# Altium footprint library 左手键盘1.PcbLib: 20 footprints (part 1 of 2)
Each footprint in its own frame and in the unit in brackets; x right, y up, seen from the top. Pads: shape width x height; smd on the part's side, far side on the other; paste and mask are expansions set on the pad; w line width, h text height; cw(c..) or ccw(c..) is an arc to the next point about the centre after c.
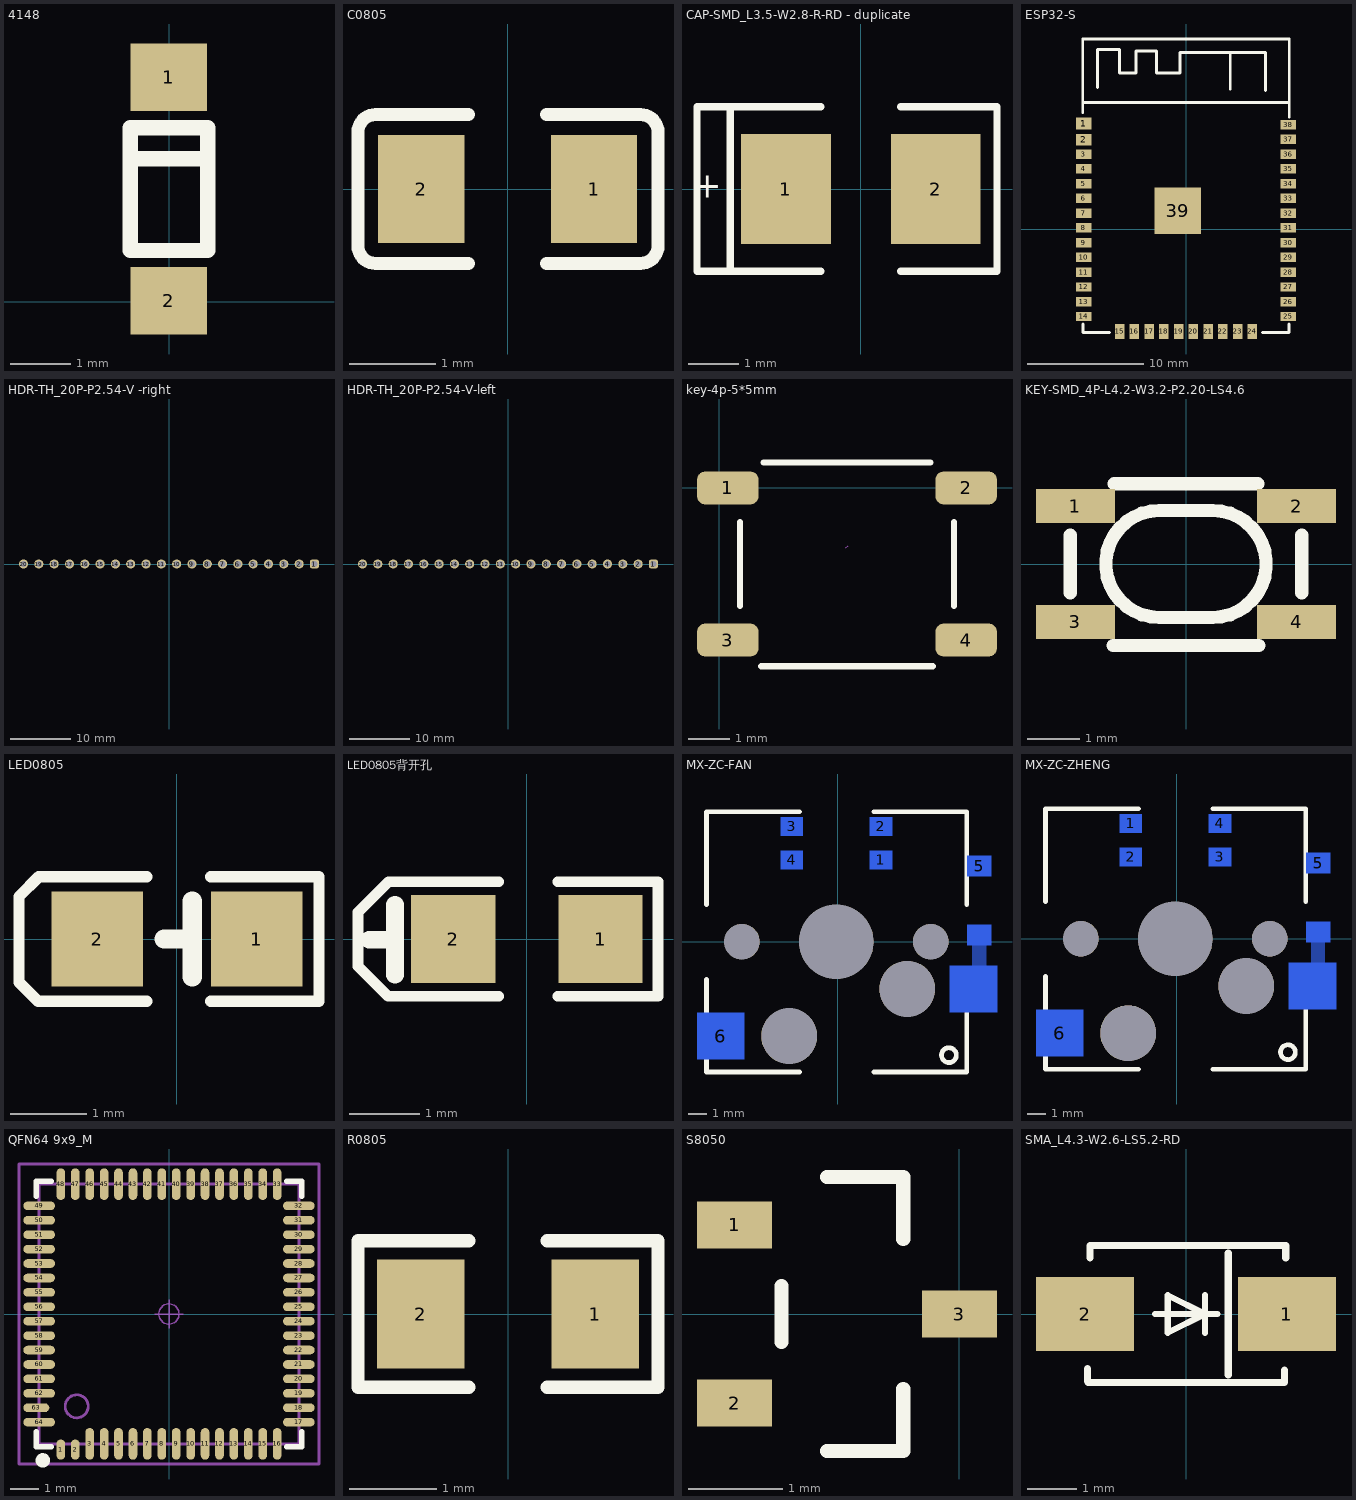
[diagram p0: the footprints below, top view; thin cyan lines are the x and y axes]

## 4148 [mm]
pads (2):
  rect 1.27x1.118 smd: 1(-0.01,3.729) 2(-0.01,0.02)
Top Overlay:
  lines w0.254: -0.65,2.377 0.64,2.377 ; -0.65,0.853 0.64,0.853 0.64,2.889 -0.65,2.889 -0.65,0.853
3D body "User Library-Diode MELF.STEP": height 1.55, standoff 0.05, extent -0.76,0.14 0.74,3.64

## C0805 [mm]
pads (2):
  rect 1x1.25 smd: 1(1,0) 2(-1,0)
Top Overlay:
  lines w0.15: -1.73,-0.66 ccw(c-1.53,-0.66) -1.53,-0.86 -0.45,-0.86 ; -1.73,-0.65 -1.73,0.65 ; -1.73,0.66 cw(c-1.53,0.66) -1.53,0.86 -0.45,0.86 ; 0.45,-0.86 1.53,-0.86 ; 0.45,0.86 1.54,0.86 cw(c1.54,0.66) 1.74,0.66 ; 1.54,-0.86 ccw(c1.54,-0.66) 1.74,-0.66 1.74,0.67
3D body "Capacitor 0805 SMD1.step": height 0.78, standoff 0, extent -1,-0.625 1,0.625

## CAP-SMD_L3.5-W2.8-R-RD - duplicate [mm]
pads (2):
  rect 1.8x2.2 smd: 1(-1.501,0) 2(1.501,0)
Top Overlay:
  lines w0.15: -2.727,-1.65 -0.8,-1.65 ; -2.727,1.65 -0.8,1.65 ; 0.8,-1.65 2.727,-1.65 2.727,1.65 0.8,1.65 ; -3.28,-1.65 -2.61,-1.65 -2.61,1.65 -3.28,1.65 -3.28,-1.65
  text "+" at -2.78,0.263 h0.5
3D body "User Library-AVX_BCASE.STEP": height 2.03, standoff 0, extent -1.85,-1.465 1.85,1.465

## ESP32-S [mm]
pads (39):
  rect 1.3x1 smd: 1(-8.8,9.1) 2(-8.8,7.7)
  rect 1.3x0.8 smd: 3(-8.8,6.465) 4(-8.8,5.195) 5(-8.8,3.925) 6(-8.8,2.655) 7(-8.8,1.385) 8(-8.8,0.115) 9(-8.8,-1.155) 10(-8.8,-2.425) 11(-8.8,-3.695) 12(-8.8,-4.965) 13(-8.8,-6.235) 14(-8.8,-7.505) 25(8.8,-7.505) 26(8.8,-6.235) 27(8.8,-4.965) 28(8.8,-3.695) 29(8.8,-2.425) 30(8.8,-1.155) 31(8.8,0.115) 32(8.8,1.385) 33(8.8,2.655) 34(8.8,3.925) 35(8.8,5.195) 36(8.8,6.465) 37(8.8,7.735) 38(8.8,9.005)
  rect 0.8x1.3 smd: 15(-5.715,-8.8) 16(-4.445,-8.8) 17(-3.175,-8.8) 18(-1.905,-8.8) 19(-0.635,-8.8) 20(0.635,-8.8) 21(1.905,-8.8) 22(3.175,-8.8) 23(4.445,-8.8) 24(5.715,-8.8)
  rect 4x4 smd: 39(-0.71,1.605)
Top Overlay:
  lines w0.254: -8.89,10.033 -8.89,16.376 8.89,16.376 8.89,9.645 ; -8.89,10.915 8.89,10.915 ; -8.88,-8.15 -8.88,-8.882 -6.594,-8.882 ; -7.62,12.184 -7.62,15.486 -5.715,15.486 -5.715,13.454 -4.318,13.454 -4.318,15.359 -2.54,15.359 -2.54,13.454 -0.508,13.454 -0.508,15.232 6.858,15.232 6.858,11.93 ; 3.81,12.058 3.81,15.233 ; 6.594,-8.882 8.88,-8.882 8.88,-8.15
3D body "User Library-ESP321.STEP": height 2.91, standoff -0.01, extent -9,-9 9,16.5

## HDR-TH_20P-P2.54-V -right [mm]
pads (20):
  rrect50% 1.5x1.5 hole 1: 1(24.13,0)
  round 1.5 hole 1: 2(21.59,0) 3(19.05,0) 4(16.51,0) 5(13.97,0) 6(11.43,0) 7(8.89,0) 8(6.35,0) 9(3.81,0) 10(1.27,0) 11(-1.27,0) 12(-3.81,0) 13(-6.35,0) 14(-8.89,0) 15(-11.43,0) 16(-13.97,0) 17(-16.51,0) 18(-19.05,0) 19(-21.59,0) 20(-24.13,0)
3D body "HDR2.54-1P_H.STEP": height 1.85, standoff -6, extent 22.86,-7.77 25.4,1.27
3D body "HDR2.54-1P_H.STEP": height 1.85, standoff -6, extent 20.32,-7.77 22.86,1.27
3D body "HDR2.54-1P_H.STEP": height 1.85, standoff -6, extent 17.78,-7.77 20.32,1.27
3D body "HDR2.54-1P_H.STEP": height 1.85, standoff -6, extent 15.24,-7.77 17.78,1.27
3D body "HDR2.54-1P_H.STEP": height 1.85, standoff -6, extent 12.7,-7.77 15.24,1.27
3D body "HDR2.54-1P_H.STEP": height 1.85, standoff -6, extent 10.16,-7.77 12.7,1.27
3D body "HDR2.54-1P_H.STEP": height 1.85, standoff -6, extent 7.62,-7.77 10.16,1.27
3D body "HDR2.54-1P_H.STEP": height 1.85, standoff -6, extent 5.08,-7.77 7.62,1.27
3D body "HDR2.54-1P_H.STEP": height 1.85, standoff -6, extent 2.54,-7.77 5.08,1.27
3D body "HDR2.54-1P_H.STEP": height 1.85, standoff -6, extent 0,-7.77 2.54,1.27
3D body "HDR2.54-1P_H.STEP": height 1.85, standoff -6, extent -2.54,-7.77 0,1.27
3D body "HDR2.54-1P_H.STEP": height 1.85, standoff -6, extent -5.08,-7.77 -2.54,1.27
3D body "HDR2.54-1P_H.STEP": height 1.85, standoff -6, extent -7.62,-7.77 -5.08,1.27
3D body "HDR2.54-1P_H.STEP": height 1.85, standoff -6, extent -10.16,-7.77 -7.62,1.27
3D body "HDR2.54-1P_H.STEP": height 1.85, standoff -6, extent -12.7,-7.77 -10.16,1.27
3D body "HDR2.54-1P_H.STEP": height 1.85, standoff -6, extent -15.24,-7.77 -12.7,1.27
3D body "HDR2.54-1P_H.STEP": height 1.85, standoff -6, extent -17.78,-7.77 -15.24,1.27
3D body "HDR2.54-1P_H.STEP": height 1.85, standoff -6, extent -20.32,-7.77 -17.78,1.27
3D body "HDR2.54-1P_H.STEP": height 1.85, standoff -6, extent -22.86,-7.77 -20.32,1.27
3D body "HDR2.54-1P_H.STEP": height 1.85, standoff -6, extent -25.4,-7.77 -22.86,1.27

## HDR-TH_20P-P2.54-V-left [mm]
pads (20):
  rrect50% 1.5x1.5 hole 1: 1(24.13,0)
  round 1.5 hole 1: 2(21.59,0) 3(19.05,0) 4(16.51,0) 5(13.97,0) 6(11.43,0) 7(8.89,0) 8(6.35,0) 9(3.81,0) 10(1.27,0) 11(-1.27,0) 12(-3.81,0) 13(-6.35,0) 14(-8.89,0) 15(-11.43,0) 16(-13.97,0) 17(-16.51,0) 18(-19.05,0) 19(-21.59,0) 20(-24.13,0)
3D body "HDR2.54-1P_H.STEP": height 1.85, standoff -6, extent 22.86,-1.27 25.4,7.77
3D body "HDR2.54-1P_H.STEP": height 1.85, standoff -6, extent 17.78,-1.27 20.32,7.77
3D body "HDR2.54-1P_H.STEP": height 1.85, standoff -6, extent 15.24,-1.27 17.78,7.77
3D body "HDR2.54-1P_H.STEP": height 1.85, standoff -6, extent 12.7,-1.27 15.24,7.77
3D body "HDR2.54-1P_H.STEP": height 1.85, standoff -6, extent 10.16,-1.27 12.7,7.77
3D body "HDR2.54-1P_H.STEP": height 1.85, standoff -6, extent 7.62,-1.27 10.16,7.77
3D body "HDR2.54-1P_H.STEP": height 1.85, standoff -6, extent 5.08,-1.27 7.62,7.77
3D body "HDR2.54-1P_H.STEP": height 1.85, standoff -6, extent 2.54,-1.27 5.08,7.77
3D body "HDR2.54-1P_H.STEP": height 1.85, standoff -6, extent 0,-1.27 2.54,7.77
3D body "HDR2.54-1P_H.STEP": height 1.85, standoff -6, extent -2.54,-1.27 0,7.77
3D body "HDR2.54-1P_H.STEP": height 1.85, standoff -6, extent -5.08,-1.27 -2.54,7.77
3D body "HDR2.54-1P_H.STEP": height 1.85, standoff -6, extent -7.62,-1.27 -5.08,7.77
3D body "HDR2.54-1P_H.STEP": height 1.85, standoff -6, extent -10.16,-1.27 -7.62,7.77
3D body "HDR2.54-1P_H.STEP": height 1.85, standoff -6, extent -12.7,-1.27 -10.16,7.77
3D body "HDR2.54-1P_H.STEP": height 1.85, standoff -6, extent -15.24,-1.27 -12.7,7.77
3D body "HDR2.54-1P_H.STEP": height 1.85, standoff -6, extent -17.78,-1.27 -15.24,7.77
3D body "HDR2.54-1P_H.STEP": height 1.85, standoff -6, extent -20.32,-1.27 -17.78,7.77
3D body "HDR2.54-1P_H.STEP": height 1.85, standoff -6, extent -22.86,-1.27 -20.32,7.77
3D body "HDR2.54-1P_H.STEP": height 1.85, standoff -6, extent -25.4,-1.27 -22.86,7.77
3D body "HDR2.54-1P_H.STEP": height 1.85, standoff -6, extent 20.32,-1.27 22.86,7.77

## key-4p-5*5mm [mm] "贴片轻触开关"
pads (4):
  rrect50% 1.5x0.8 smd: 1(0.21,-0.01) 2(6.01,-0.01) 3(0.21,-3.71) 4(6.01,-3.71)
Top Overlay:
  lines w0.15: 0.51,-2.879 0.51,-0.841 ; 1.023,-4.35 5.197,-4.35 ; 1.085,0.61 5.135,0.61 ; 5.71,-2.879 5.71,-0.841
Mechanical 15:
  lines w0.003: 3.085,-1.464 3.135,-1.413
3D body "User Library-44-1.STEP": height 1.5, standoff 0, extent -0.09,-4.42 6.31,0.68

## KEY-SMD_4P-L4.2-W3.2-P2.20-LS4.6 [mm]
pads (4):
  rect 1.5x0.65 smd: 1(-2.1,1.1) 2(2.1,1.1) 3(-2.1,-1.1) 4(2.1,-1.1)
Top Overlay:
  lines w0.254: -2.2,-0.544 -2.2,0.544 ; -1.381,-1.55 1.381,-1.55 ; -1.366,1.524 1.366,1.524 ; 2.2,-0.544 2.2,0.544 ; -0.508,-1.016 cw(c-0.508,0) -0.508,1.016 0.508,1.016 cw(c0.508,0) 0.508,-1.016 -0.508,-1.016
3D body "User Library-SKSGAAE010 3_2x2_7x1_4.STEP": height 1.6, standoff 0, extent -1.75,-1.35 1.75,1.35

## LED0805 [mm]
pads (2):
  rect 1.2x1.25 smd: 1(1.05,0) 2(-1.05,0)
Top Overlay:
  lines w0.15: -0.4,-0.82 -1.83,-0.82 -2.08,-0.57 -2.08,0.56 -1.82,0.82 -0.4,0.82 ; 0.443,-0.82 1.87,-0.82 1.87,-0.82 1.87,0.82 0.443,0.82
  lines w0.254: -0.169,0 0.1,0 ; 0.2,-0.5 0.2,0.5
3D body "everlight-17-21-0805LED-red.STEP": height 1.1, standoff -0.01, extent -1,-0.625 1,0.625

## LED0805背开孔 [mm]
pads (2):
  rect 1.2x1.25 smd: 1(1.05,0) 2(-1.05,0)
Top Overlay:
  lines w0.15: -0.4,-0.82 -1.98,-0.82 -2.41,-0.39 -2.41,0.38 -1.97,0.82 -0.4,0.82 ; 0.443,-0.82 1.87,-0.82 1.87,-0.82 1.87,0.82 0.443,0.82
  lines w0.254: -2.249,-0.01 -1.98,-0.01 ; -1.88,-0.51 -1.88,0.49
3D body "everlight-17-21-0805LED-red.STEP": height 0.61, standoff -0.5, extent -1,-0.625 1,0.625

## MX-ZC-FAN [mm]
pads (13):
  rect 1.2x1 smd far side: 1(2.336,4.4) 2(2.336,6.2) 3(-2.464,6.2) 4(-2.464,4.4)
  rect 1.27x1.118 smd far side: 5(7.62,4.069) ""(7.62,0.36)
  rect 2.55x2.499 smd far side: 6(-6.286,-5.08) ""(7.302,-2.54)
  round 1.905 hole 1.905 unplated: ""(-5.143,0) ""(5.016,0)
  round 3 hole 3 unplated: ""(-2.603,-5.08) ""(3.746,-2.54)
  round 4 hole 4 unplated: ""(-0.064,0)
Bottom Layer:
  lines w0.762: 7.62,-3.142 7.62,0.36
Top Overlay:
  circle w0.254: c5.992,-6.106 r0.399
  circle w0.254: c5.992,-6.106 r0.399
  lines w0.254: -7.048,-2.015 -7.048,-7.015 -2.048,-7.015 ; -7.048,1.985 -7.048,6.985 -2.048,6.985 ; 1.951,-7.015 6.951,-7.015 6.951,-2.015 ; 1.951,6.985 6.951,6.985 6.951,1.985
Bottom Overlay:
  region: -1.959,7.302 -2.458,7.302 -2.458,6.802
  lines w0.152: -3.78,6.159 -3.356,6.159 ; 3.278,4.308 3.702,4.308 ; 3.502,4.083 3.502,4.508
  lines w0.254: 2.476,-1.016 3.238,-1.016 ; 2.532,-1.016 cw(c0.488,-0.73) 0.444,-2.794 -4.889,-2.794 -4.889,-6.858 4.255,-6.858 ccw(c4.263,-5.089) 6.032,-5.08 6.032,-1.016 2.73,-1.016 ; 6.95,2.697 8.24,2.697 ; 6.95,1.173 6.95,3.209 8.24,3.209 8.24,1.173 6.95,1.173
3D body "User Library-Diode MELF.STEP": height -0.85, standoff -2.35, extent 6.87,0.48 8.37,3.98
3D body "User Library-MX-Blue.STEP": height 14.9, standoff -4, extent -7.856,-7.79 7.743,7.81

## MX-ZC-ZHENG [mm]
pads (13):
  rect 1.2x1 smd far side: 1(-2.464,6.2) 2(-2.464,4.4) 3(2.336,4.4) 4(2.336,6.2)
  rect 1.27x1.118 smd far side: 5(7.62,4.069) ""(7.62,0.36)
  rect 2.55x2.499 smd far side mask+0.102: 6(-6.286,-5.08)
  round 1.905 hole 1.905 unplated: ""(-5.143,0) ""(5.016,0)
  round 3 hole 3 unplated: ""(-2.603,-5.08) ""(3.746,-2.54)
  round 4 hole 4 unplated: ""(-0.064,0)
  rect 2.55x2.499 smd far side: ""(7.302,-2.54)
Bottom Layer:
  lines w0.762: 7.607,-3.091 7.607,0.297
Top Overlay:
  circle w0.254: c5.992,-6.106 r0.399
  circle w0.254: c5.992,-6.106 r0.399
  lines w0.254: -7.048,-2.015 -7.048,-7.015 -2.048,-7.015 ; -7.048,1.985 -7.048,6.985 -2.048,6.985 ; 1.951,-7.015 6.951,-7.015 6.951,-2.015 ; 1.951,6.985 6.951,6.985 6.951,1.985
Bottom Overlay:
  region: 1.861,3.248 2.361,3.248 2.361,3.748
  lines w0.152: -3.799,6.242 -3.375,6.242 ; -3.6,6.042 -3.6,6.467 ; 3.258,4.391 3.683,4.391
  lines w0.254: 2.476,-1.016 3.238,-1.016 ; 2.532,-1.016 cw(c0.488,-0.73) 0.444,-2.794 -4.889,-2.794 -4.889,-6.858 4.255,-6.858 ccw(c4.263,-5.089) 6.032,-5.08 6.032,-1.016 2.73,-1.016 ; 6.99,2.697 8.25,2.697 ; 6.95,1.173 6.95,3.209 8.24,3.209 8.24,1.173 6.95,1.173
3D body "User Library-MX-Blue.STEP": height 14.9, standoff -4, extent -7.83,-7.83 7.77,7.77
3D body "User Library-Diode MELF.STEP": height -0.85, standoff -2.35, extent 6.87,0.46 8.37,3.96

## QFN64 9x9_M [mm] "64脚，长x宽x高：9x9x1mm，脚距：0.5mm"
pads (64):
  oval 0.3x0.7 smd: 1(-3.75,-4.7) 2(-3.25,-4.7)
  oval 0.3x1.1 smd: 3(-2.75,-4.5) 4(-2.25,-4.5) 5(-1.75,-4.5) 6(-1.25,-4.5) 7(-0.75,-4.5) 8(-0.25,-4.5) 9(0.25,-4.5) 10(0.75,-4.5) 11(1.25,-4.5) 12(1.75,-4.5) 13(2.25,-4.5) 14(2.75,-4.5) 15(3.25,-4.5) 16(3.75,-4.5) 33(3.75,4.5) 34(3.25,4.5) 35(2.75,4.5) 36(2.25,4.5) 37(1.75,4.5) 38(1.25,4.5) 39(0.75,4.5) 40(0.25,4.5) 41(-0.25,4.5) 42(-0.75,4.5) 43(-1.25,4.5) 44(-1.75,4.5) 45(-2.25,4.5) 46(-2.75,4.5) 47(-3.25,4.5) 48(-3.75,4.5)
  oval 1.1x0.3 smd: 17(4.5,-3.75) 18(4.5,-3.25) 19(4.5,-2.75) 20(4.5,-2.25) 21(4.5,-1.75) 22(4.5,-1.25) 23(4.5,-0.75) 24(4.5,-0.25) 25(4.5,0.25) 26(4.5,0.75) 27(4.5,1.25) 28(4.5,1.75) 29(4.5,2.25) 30(4.5,2.75) 31(4.5,3.25) 32(4.5,3.75) 49(-4.5,3.75) 50(-4.5,3.25) 51(-4.5,2.75) 52(-4.5,2.25) 53(-4.5,1.75) 54(-4.5,1.25) 55(-4.5,0.75) 56(-4.5,0.25) 57(-4.5,-0.25) 58(-4.5,-0.75) 59(-4.5,-1.25) 60(-4.5,-1.75) 61(-4.5,-2.25) 62(-4.5,-2.75) 64(-4.5,-3.75)
  oval 0.9x0.3 smd: 63(-4.6,-3.25)
Top Overlay:
  circle w0.25: c-4.375,-5.075 r0.125
  lines w0.178: -4.6,-4.075 -4.6,-4.6 -4.075,-4.6 ; -4.6,4.075 -4.6,4.6 -4.075,4.6 ; 4.075,-4.6 4.6,-4.6 4.6,-4.075 ; 4.075,4.6 4.6,4.6 4.6,4.075
Mechanical 13:
  circle w0.1: c-3.2,-3.2 r0.4
  lines w0.1: -4.5,-4.5 -4.5,4.5 4.5,4.5 4.5,-4.5 -4.5,-4.5
Mechanical 15:
  circle w0.05: c0,0 r0.35
  lines w0.05: -0.5,0 0.5,0 ; 0,-0.5 0,0.5
  lines w0.1: -5.2,-5.2 -5.2,5.2 5.2,5.2 5.2,-5.2 -5.2,-5.2
3D body "QFN64-9X9.STEP": height 0.95, standoff -0.05, extent -4.51,-4.51 4.51,4.51

## R0805 [mm]
pads (2):
  rect 1x1.25 smd: 1(1,0) 2(-1,0)
Top Overlay:
  lines w0.15: -0.45,-0.84 -1.72,-0.84 -1.72,0.84 -0.45,0.84 ; 0.45,-0.84 1.72,-0.84 1.72,0.84 0.45,0.84
3D body "User Library-R_0805.STEP": height 0.49, standoff -0.01, extent -1,-0.625 1,0.625

## S8050 [mm]
pads (3):
  rect 0.8x0.5 smd: 1(-2.4,0.95) 2(-2.4,-0.95) 3(0,0)
Top Overlay:
  lines w0.15: -1.9,-0.3 -1.9,0.3 ; -1.415,-1.46 -0.6,-1.46 -0.6,-0.8 ; -1.415,1.46 -0.6,1.46 -0.6,0.8
3D body "SOT23-3.STEP": height 1.05, standoff 0, extent -2.47,-1.5 -0.07,1.5

## SMA_L4.3-W2.6-LS5.2-RD [mm]
pads (2):
  rect 2x1.5 smd: 1(2.057,0) 2(-2.057,0)
Top Overlay:
  lines w0.127: -0.627,0 0.643,0 ; 0.389,-0.381 0.389,0 ; 0.389,0.381 0.389,0 ; 0.389,0 -0.373,-0.381 -0.373,0 -0.373,0.381 0.389,0
  lines w0.15: -2.007,-1.367 -2.007,-1.118 ; -1.991,-1.397 2.007,-1.397 2.007,-1.147 ; -1.956,1.147 -1.956,1.397 2.032,1.397 2.032,1.147 ; 0.864,-1.245 0.864,1.245
3D body "SW3dPS-DO-214AC SMA.STEP": height 2.4, standoff 0, extent -2.6,-1.29 2.6,1.31